# Altium footprint library ESKDPcbLib.PcbLib: 608 footprints (part 12 of 38)
Each footprint in its own frame and in the unit in brackets; x right, y up, seen from the top. Pads: shape width x height; smd on the part's side, far side on the other; paste and mask are expansions set on the pad; w line width, h text height; cw(c..) or ccw(c..) is an arc to the next point about the centre after c.
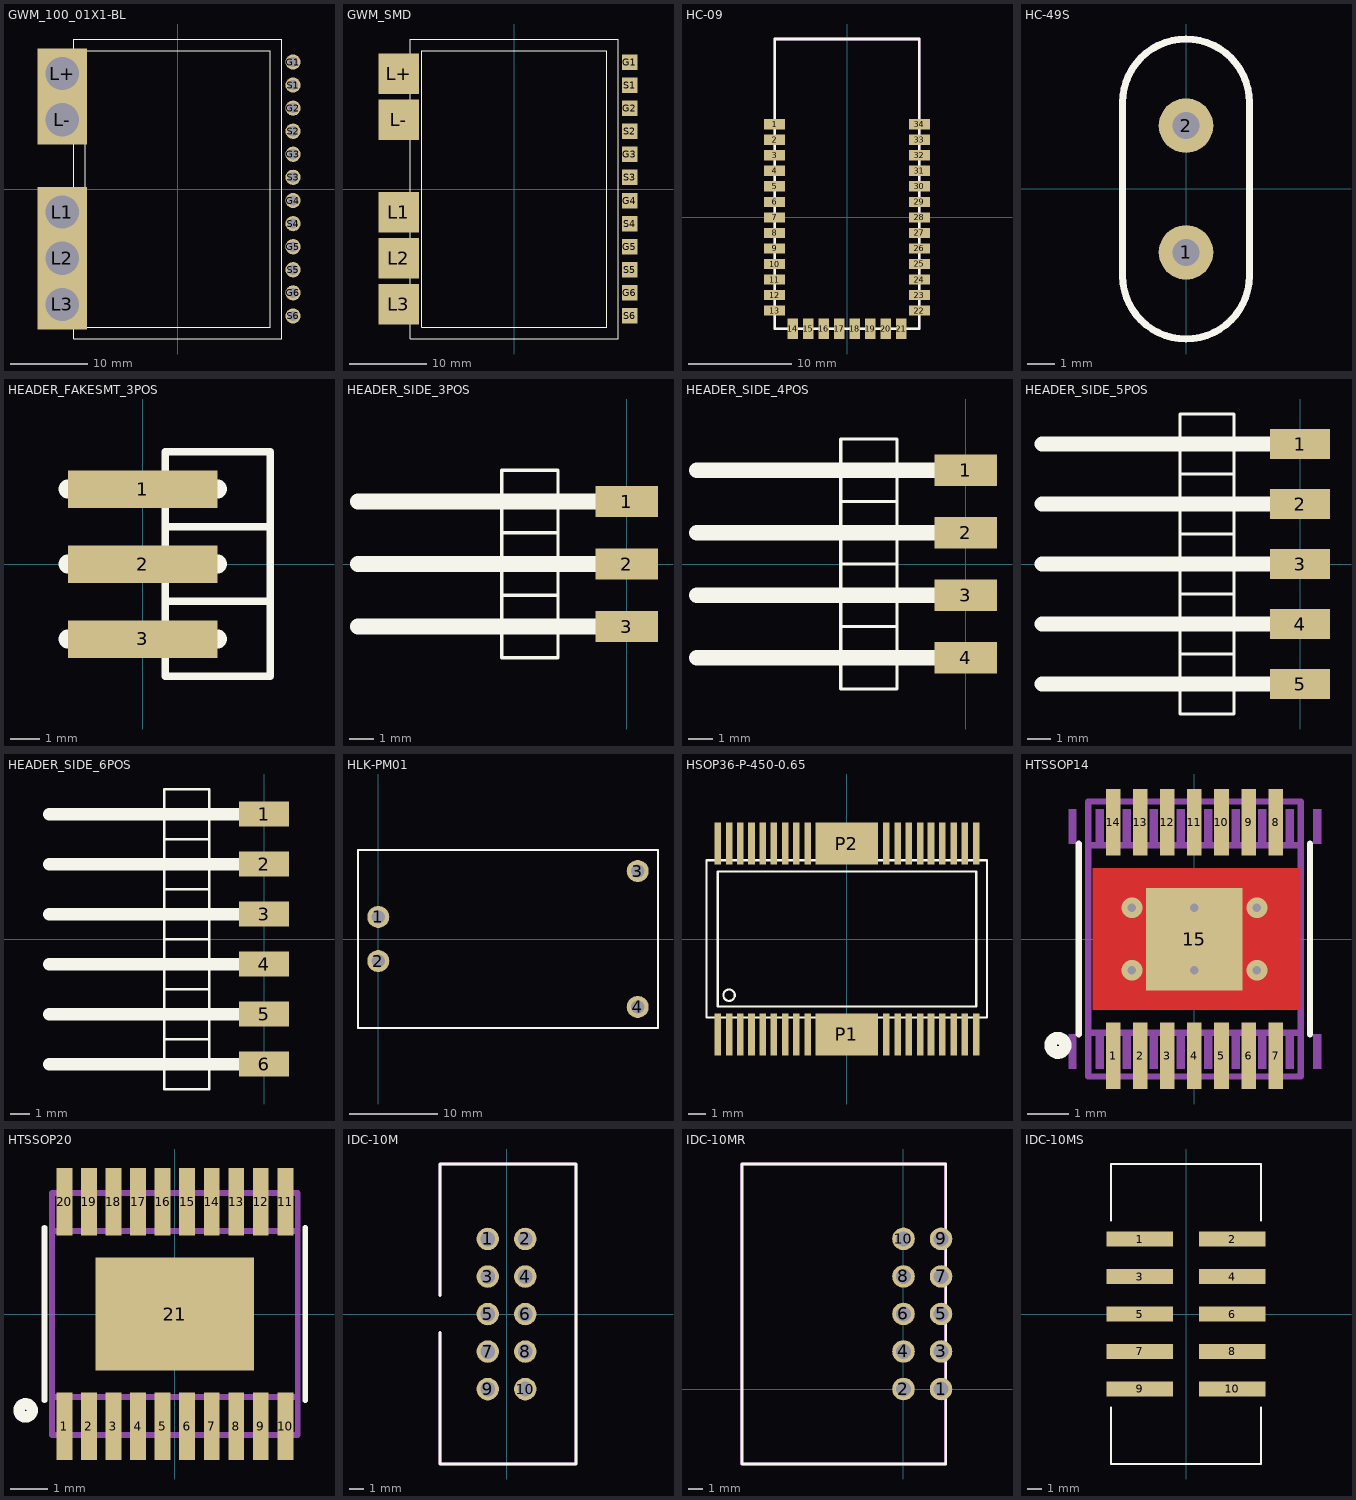
[diagram p11: the footprints below, top view; thin cyan lines are the x and y axes]

## GWM_100_01X1-BL [mil]
pads (17):
  round 78 hole 52: G1(591,650) G2(591,414) G3(591,178) G4(591,-59.06) G5(591,-295.28) G6(591,-531.5) S1(591,532) S2(591,296) S3(591,60) S4(591,-177.17) S5(591,-413.39) S6(591,-649.61)
  rect 255x255 hole 170: L1(-590.55,-118.11) L2(-590.55,-354.33) L3(-590.55,-590.55) L+(-590.55,591) L-(-590.55,355)
Top Overlay:
  lines w5: -531.5,-767.72 -531.5,768 532,768 532,-767.72 -531.5,-767.72 ; -472.44,-708.66 473,-708.66 473,709 -472.44,709 -472.44,-708.66

## GWM_SMD [mil]
pads (17):
  rect 79x79 smd: G1(591,650) G2(591,414) G3(591,178) G4(591,-59.06) G5(591,-295.28) G6(591,-531.5) S1(591,532) S2(591,296) S3(591,60) S4(591,-177.17) S5(591,-413.39) S6(591,-649.61)
  rect 207x207 smd: L1(-590.55,-118.11) L2(-590.55,-354.33) L3(-590.55,-590.55) L+(-590.55,591) L-(-590.55,355)
Top Overlay:
  lines w5: -531.5,-767.72 532,-767.72 532,768 -531.5,768 -531.5,-767.72 ; -472.44,-708.66 -472.44,709 473,709 473,-708.66 -472.44,-708.66

## HC-09 [mm]
pads (34):
  rect 2x1 smd: 1(-7,9) 2(-7,7.5) 3(-7,6) 4(-7,4.5) 5(-7,3) 6(-7,1.5) 7(-7,0) 8(-7,-1.5) 9(-7,-3) 10(-7,-4.5) 11(-7,-6) 12(-7,-7.5) 13(-7,-9) 22(7,-9) 23(7,-7.5) 24(7,-6) 25(7,-4.5) 26(7,-3) 27(7,-1.5) 28(7,0) 29(7,1.5) 30(7,3) 31(7,4.5) 32(7,6) 33(7,7.5) 34(7,9)
  rect 1x2 smd: 14(-5.25,-10.75) 15(-3.75,-10.75) 16(-2.25,-10.75) 17(-0.75,-10.75) 18(0.75,-10.75) 19(2.25,-10.75) 20(3.75,-10.75) 21(5.25,-10.75)
Top Overlay:
  lines w0.254: -7,-10.75 -7,17.25 7,17.25 7,-10.75 -7,-10.75
Mechanical 7:
  lines w0.254: -7,-10.75 -7,17.25 7,17.25 7,-10.75 -7,-10.75
Mechanical 10:
  text ".Designator" at 9.75,13.25 h1.52
  text ".Comment" at 9.75,14.5 h1.52
3D body: height 2.35, standoff 0, extent -7,-10.755 7.02,17.255

## HC-49S [mm]
pads (2):
  round 2 hole 1: 1(0,-2.325) 2(0,2.325)
Top Overlay:
  lines w0.254: -2.325,-3.191 ccw(c0,-3.175) 2.325,-3.191 2.325,3.175 ccw(c0,3.175) -2.325,3.175 -2.325,-3.191
Mechanical 7:
  lines w0.254: -2.325,-3.191 ccw(c0,-3.175) 2.325,-3.191 2.325,3.175 ccw(c0,3.175) -2.325,3.175 -2.325,-3.191
Mechanical 10:
  text ".Comment" at 3.81,2.755 h1.52
  text ".Designator" at 3.81,1.485 h1.52
3D body "HC49S-1.STEP": height 3.6, standoff -3, extent -2.3,-5.505 2.191,5.475

## HEADER_FAKESMT_3POS [mm]
pads (3):
  rect 5.08x1.27 smd: 1(0,2.54) 2(0,0) 3(0,-2.54)
Top Overlay:
  lines w0.254: 0.762,-1.27 4.318,-1.27 ; 0.762,-1.27 0.762,1.27 ; 0.762,-1.27 0.762,-3.81 4.318,-3.81 4.318,-1.27 ; 0.762,1.27 4.318,1.27 ; 0.762,1.27 0.762,3.81 4.318,3.81 4.318,1.27 ; 4.318,-1.27 4.318,1.27
  lines w0.635: -2.54,-2.54 2.54,-2.54 ; -2.54,0 2.54,0 ; -2.54,2.54 2.54,2.54

## HEADER_SIDE_3POS [mm]
pads (3):
  rect 2.54x1.27 smd: 1(0,2.54) 2(0,0) 3(0,-2.54)
Top Overlay:
  lines w0.127: -5.08,-1.27 -2.794,-1.27 ; -5.08,-1.27 -5.08,-3.81 -2.794,-3.81 -2.794,-1.27 ; -5.08,-1.27 -5.08,1.27 ; -5.08,1.27 -2.794,1.27 ; -5.08,1.27 -5.08,3.81 -2.794,3.81 -2.794,1.27 ; -2.794,-1.27 -2.794,1.27
  lines w0.635: -10.922,-2.54 -0.508,-2.54 ; -10.922,0 -0.508,0 ; -10.922,2.54 -0.508,2.54

## HEADER_SIDE_4POS [mm]
pads (4):
  rect 2.54x1.27 smd: 1(0,3.81) 2(0,1.27) 3(0,-1.27) 4(0,-3.81)
Top Overlay:
  lines w0.127: -2.794,-2.54 -5.08,-2.54 ; -5.08,-2.54 -5.08,0 ; -5.08,-2.54 -5.08,-5.08 -2.794,-5.08 -2.794,0 ; -5.08,0 -5.08,2.54 ; -5.08,0 -2.794,0 ; -5.08,2.54 -5.08,5.08 -2.794,5.08 -2.794,2.54 ; -5.08,2.54 -2.794,2.54 ; -2.794,0 -2.794,2.54
  lines w0.635: -10.922,-3.81 -0.508,-3.81 ; -10.922,-1.27 -0.508,-1.27 ; -10.922,1.27 -0.508,1.27 ; -10.922,3.81 -0.508,3.81

## HEADER_SIDE_5POS [mm]
pads (5):
  rect 2.54x1.27 smd: 1(0,5.08) 2(0,2.54) 3(0,0) 4(0,-2.54) 5(0,-5.08)
Top Overlay:
  lines w0.127: -2.794,-3.81 -5.08,-3.81 ; -2.794,-1.27 -5.08,-1.27 ; -5.08,-3.81 -5.08,-6.35 -2.794,-6.35 -2.794,1.27 ; -5.08,-3.81 -5.08,-1.27 ; -5.08,-1.27 -5.08,1.27 ; -5.08,1.27 -2.794,1.27 ; -5.08,1.27 -5.08,3.81 ; -5.08,3.81 -2.794,3.81 ; -5.08,3.81 -5.08,6.35 -2.794,6.35 -2.794,3.81 ; -2.794,1.27 -2.794,3.81
  lines w0.635: -10.922,-5.08 -0.508,-5.08 ; -10.922,-2.54 -0.508,-2.54 ; -10.922,0 -0.508,0 ; -10.922,2.54 -0.508,2.54 ; -10.922,5.08 -0.508,5.08

## HEADER_SIDE_6POS [mm]
pads (6):
  rect 2.54x1.27 smd: 1(0,6.35) 2(0,3.81) 3(0,1.27) 4(0,-1.27) 5(0,-3.81) 6(0,-6.35)
Top Overlay:
  lines w0.127: -5.08,-5.08 -5.08,-2.54 ; -5.08,-5.08 -5.08,-7.62 -2.794,-7.62 -2.794,-5.08 ; -5.08,-5.08 -2.794,-5.08 ; -5.08,-2.54 -5.08,0 ; -5.08,-2.54 -2.794,-2.54 ; -5.08,0 -5.08,2.54 ; -5.08,0 -2.794,0 ; -5.08,0 -2.794,0 ; -5.08,2.54 -5.08,5.08 ; -5.08,2.54 -2.794,2.54 ; -5.08,5.08 -5.08,7.62 -2.794,7.62 -2.794,5.08 ; -5.08,5.08 -2.794,5.08 ; -2.794,-5.08 -2.794,-2.54 ; -2.794,-2.54 -2.794,0 ; -2.794,0 -2.794,2.54 ; -2.794,2.54 -2.794,5.08
  lines w0.635: -10.922,-6.35 -0.508,-6.35 ; -10.922,-3.81 -0.508,-3.81 ; -10.922,-1.27 -0.508,-1.27 ; -10.922,1.27 -0.508,1.27 ; -10.922,3.81 -0.508,3.81 ; -10.922,6.35 -0.508,6.35

## HLK-PM01 [mm]
pads (4):
  round 2.5 hole 1.5: 1(0,2.5) 2(0,-2.5) 3(29.4,7.7) 4(29.4,-7.7)
Top Overlay:
  lines w0.254: -2.3,-10.1 -2.3,10.1 31.7,10.1 31.7,-10.1 -2.3,-10.1
Mechanical 7:
  lines w0.254: -2.3,-10.1 -2.3,10.1 31.7,10.1 31.7,-10.1 -2.3,-10.1
Mechanical 10:
  text ".Comment" at -2,10.5 h1
  text ".Designator" at -2,11.25 h1
3D body "HLK-PM01.STEP": height 17.6, standoff -2.5, extent -2.3,-10.1 31.7,10.1

## HSOP36-P-450-0.65 [mil]
pads (38):
  rect 15x95 smd: 1(-294.29,-217.52) 2(-268.7,-217.52) 3(-243.11,-217.52) 4(-217.52,-217.52) 5(-191.93,-217.52) 6(-166.34,-217.52) 7(-140.75,-217.52) 8(-115.16,-217.52) 9(-89.57,-217.52) 10(90,-217.52) 11(116,-217.52) 12(141,-217.52) 13(167,-217.52) 14(192,-217.52) 15(218,-217.52) 16(244,-217.52) 17(269,-217.52) 18(295,-217.52) 19(295,218) 20(269,218) 21(244,218) 22(218,218) 23(192,218) 24(167,218) 25(141,218) 26(116,218) 27(90,218) 28(-89.57,218) 29(-115.16,218) 30(-140.75,218) 31(-166.34,218) 32(-191.93,218) 33(-217.52,218) 34(-243.11,218) 35(-268.7,218) 36(-294.29,218)
  rect 142x95 smd: P1(0,-217.52) P2(0,218)
Top Overlay:
  circle w5: c-268.7,-127.95 r13
  lines w5: -319.88,-179.13 320,-179.13 320,180 -319.88,180 -319.88,-179.13 ; -294.29,-153.54 295,-153.54 295,154 -294.29,154 -294.29,-153.54

## HTSSOP14 [mm]
height 1.1
pads (15):
  rect 0.35x1.6 smd mask+0.075: 1(-1.95,-2.8) 2(-1.3,-2.8) 3(-0.65,-2.8) 4(0,-2.8) 5(0.65,-2.8) 6(1.3,-2.8) 7(1.95,-2.8) 8(1.95,2.8) 9(1.3,2.8) 10(0.65,2.8) 11(0,2.8) 12(-0.65,2.8) 13(-1.3,2.8) 14(-1.95,2.8)
  rect 2.31x2.46 smd mask+0.075: 15(0,-0.002)
via -1.5,0.75 diameter 0.5 hole 0.2
via -1.5,-0.75 diameter 0.5 hole 0.2
via 1.5,0.75 diameter 0.5 hole 0.2
via 1.5,-0.75 diameter 0.5 hole 0.2
via 0,-0.75 diameter 0.5 hole 0.2
via 0,0.75 diameter 0.5 hole 0.2
Top Layer:
  rectangle: -2.45,-1.7 2.55,1.7
Top Overlay:
  circle w0.3: c-3.275,-2.552 r0.175
  lines w0.152: -2.775,-2.284 -2.775,2.284 ; 2.775,-2.284 2.775,2.284
Mechanical 7:
  lines w0.152: -2.55,-2.25 2.55,-2.25 ; -2.55,2.25 2.55,2.25 ; -2.55,-3.3 2.55,-3.3 2.55,3.3 -2.55,3.3 -2.55,-3.3
Mechanical 10:
  text ".Designator" at -1.85,-5.225 h1.52
  text ".Comment" at -1.7,4.45 h1.52
Mechanical 16:
  rectangle: -3.027,-3.123 -2.823,-2.284
  rectangle: -2.377,-3.123 -2.173,-2.284
  rectangle: -1.727,-3.123 -1.523,-2.284
  rectangle: -1.077,-3.123 -0.873,-2.284
  rectangle: -0.427,-3.123 -0.223,-2.284
  rectangle: 0.229,-3.123 0.432,-2.284
  rectangle: 0.889,-3.123 1.092,-2.284
  rectangle: 1.524,-3.123 1.727,-2.284
  rectangle: 2.184,-3.123 2.388,-2.284
  rectangle: 2.845,-3.123 3.048,-2.284
  rectangle: 2.845,2.284 3.048,3.123
  rectangle: 2.184,2.284 2.388,3.123
  rectangle: 1.524,2.284 1.727,3.123
  rectangle: 0.889,2.284 1.092,3.123
  rectangle: 0.229,2.284 0.432,3.123
  rectangle: -0.427,2.284 -0.223,3.123
  rectangle: -1.077,2.284 -0.873,3.123
  rectangle: -1.727,2.284 -1.523,3.123
  rectangle: -2.377,2.284 -2.173,3.123
  rectangle: -3.027,2.284 -2.823,3.123
3D body: height 0.5, standoff 0.05, extent -2.55,-3.3 2.55,-2.2
3D body: height 0.5, standoff 0.05, extent -2.55,2.2 2.55,3.3
3D body: height 1.1, standoff 0.05, extent -2.55,-2.25 2.55,2.25

## HTSSOP20 [mm]
height 1.1
pads (21):
  rect 0.42x1.78 smd mask+0.075: 1(-2.925,-2.97) 2(-2.275,-2.97) 3(-1.625,-2.97) 4(-0.975,-2.97) 5(-0.325,-2.97) 6(0.325,-2.97) 7(0.975,-2.97) 8(1.625,-2.97) 9(2.275,-2.97) 10(2.925,-2.97) 11(2.925,2.97) 12(2.275,2.97) 13(1.625,2.97) 14(0.975,2.97) 15(0.325,2.97) 16(-0.325,2.97) 17(-0.975,2.97) 18(-1.625,2.97) 19(-2.275,2.97) 20(-2.925,2.97)
  rect 4.2x3 smd mask+0.075: 21(0,-0.002)
Top Overlay:
  circle w0.3: c-3.95,-2.552 r0.175
  lines w0.152: -3.45,-2.284 -3.45,2.284 ; 3.45,-2.284 3.45,2.284
Mechanical 7:
  lines w0.152: -3.25,-2.2 3.25,-2.2 ; -3.25,2.2 3.25,2.2 ; -3.25,-3.2 3.25,-3.2 3.25,3.2 -3.25,3.2 -3.25,-3.2
Mechanical 10:
  text ".Designator" at -1.85,-5.225 h1.52
  text ".Comment" at -1.7,4.45 h1.52
Mechanical 16:
  rectangle: -3.027,-3.123 -2.823,-2.284
  rectangle: -2.377,-3.123 -2.173,-2.284
  rectangle: -1.727,-3.123 -1.523,-2.284
  rectangle: -1.077,-3.123 -0.873,-2.284
  rectangle: -0.427,-3.123 -0.223,-2.284
  rectangle: 0.229,-3.123 0.432,-2.284
  rectangle: 0.889,-3.123 1.092,-2.284
  rectangle: 1.524,-3.123 1.727,-2.284
  rectangle: 2.184,-3.123 2.388,-2.284
  rectangle: 2.845,-3.123 3.048,-2.284
  rectangle: 2.845,2.284 3.048,3.123
  rectangle: 2.184,2.284 2.388,3.123
  rectangle: 1.524,2.284 1.727,3.123
  rectangle: 0.889,2.284 1.092,3.123
  rectangle: 0.229,2.284 0.432,3.123
  rectangle: -0.427,2.284 -0.223,3.123
  rectangle: -1.077,2.284 -0.873,3.123
  rectangle: -1.727,2.284 -1.523,3.123
  rectangle: -2.377,2.284 -2.173,3.123
  rectangle: -3.027,2.284 -2.823,3.123
3D body: height 0.5, standoff 0.05, extent -3.25,-3.2 3.25,-2.2
3D body: height 0.5, standoff 0.05, extent -3.25,2.2 3.25,3.2
3D body: height 1.1, standoff 0.05, extent -3.25,-2.2 3.25,2.2

## IDC-10M [mil]
pads (10):
  round 60 hole 39.37: 1(-50,200) 2(50,200) 3(-50,100) 4(50,100) 5(-50,0) 6(50,0) 7(-50,-100) 8(50,-100) 9(-50,-200) 10(50,-200)
Top Overlay:
  lines w7.87: -177.17,-49.21 -177.17,-399.61 185.04,-399.61 185.04,399.61 -177.17,399.61 -177.17,49.21
Mechanical 7:
  lines w7.87: -177.17,-49.21 -177.17,-399.41 185.04,-399.41 185.04,399.8 -177.17,399.8 -177.17,49.21
Mechanical 10:
  text ".Designator" at 0,500 h39.37
  text ".Comment" at 0,450 h39.37
3D body: height 366.14, standoff -122.05, extent -173.22,-399.6 185.04,399.61

## IDC-10MR [mil]
pads (10):
  round 60 hole 39.37: 1(100,0) 2(0,0) 3(100,100) 4(0,100) 5(100,200) 6(0,200) 7(100,300) 8(0,300) 9(100,400) 10(0,400)
Top Overlay:
  lines w7.87: -430.71,-199.61 -430.71,599.61 112.6,599.61 112.6,-199.61 -430.71,-199.61
Mechanical 7:
  lines w7.87: -431.1,-199.8 112.2,-199.8 112.2,599.41 -431.1,599.41 -431.1,-199.8
Mechanical 10:
  text ".Comment" at -295.28,673.23 h39.37
  text ".Designator" at -299.21,629.92 h39.37
3D body: height 350.39, standoff -123.03, extent -440.62,-200.79 117.78,599.21

## IDC-10MS [mm]
pads (10):
  rect 4.5x1 smd: 1(-3.125,5.08) 2(3.125,5.08) 3(-3.125,2.54) 4(3.125,2.54) 5(-3.125,0) 6(3.125,0) 7(-3.125,-2.54) 8(3.125,-2.54) 9(-3.125,-5.08) 10(3.125,-5.08)
Top Overlay:
  lines w0.15: -5.08,-6.35 -5.08,-10.16 5.08,-10.16 5.08,-6.35 ; -5.08,6.35 -5.08,10.16 5.08,10.16 5.08,6.35
Mechanical 7:
  lines w0.15: -5.08,-6.35 -5.08,-10.16 5.08,-10.16 5.08,-6.35 ; -5.08,6.35 -5.08,10.16 5.08,10.16 5.08,6.35
3D body: height 10.6, standoff -0.04, extent -4.825,-10.16 4.675,10.16